# Altium footprint library General.PCBLIB: 226 footprints (part 3 of 15)
Each footprint in its own frame and in the unit in brackets; x right, y up, seen from the top. Pads: shape width x height; smd on the part's side, far side on the other; paste and mask are expansions set on the pad; w line width, h text height; cw(c..) or ccw(c..) is an arc to the next point about the centre after c.
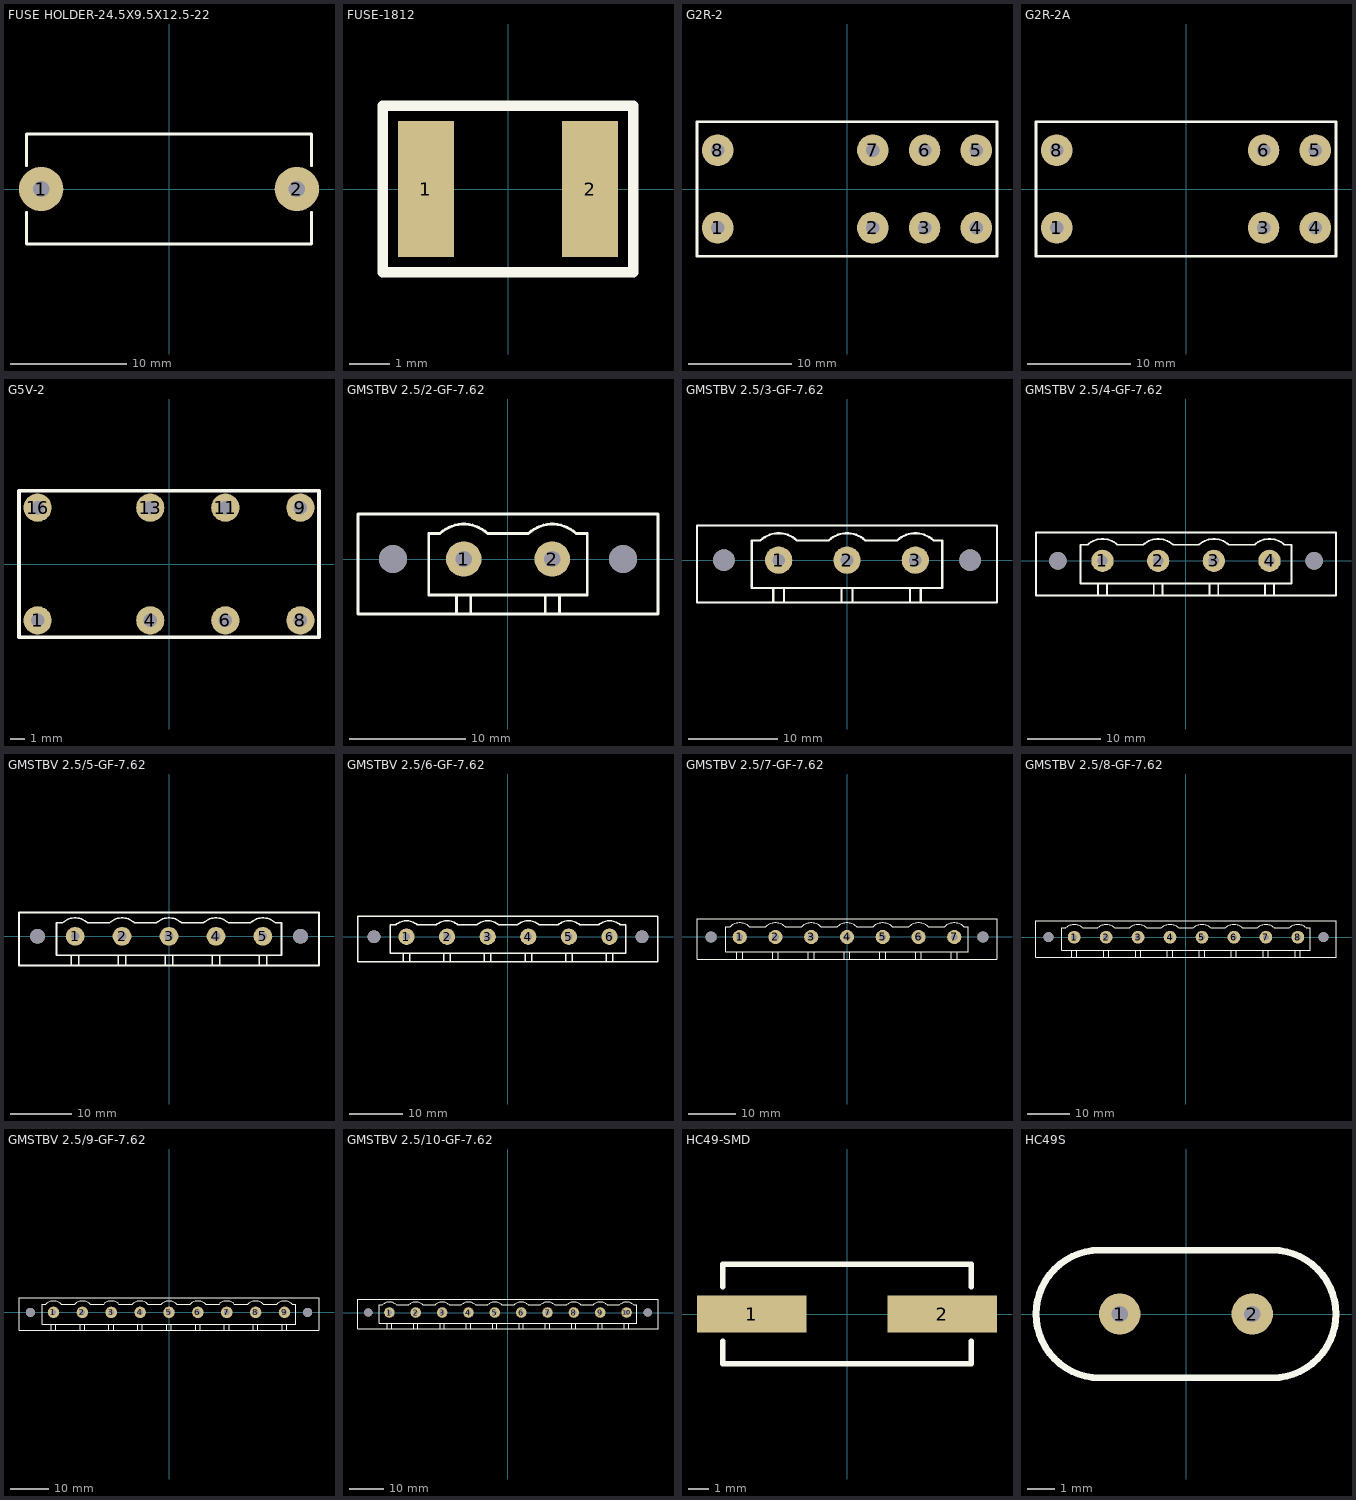
[diagram p2: the footprints below, top view; thin cyan lines are the x and y axes]

## FUSE HOLDER-24.5X9.5X12.5-22 [mm] "Fuse holder, 5*20mm fuse"
height 12.5
pads (2):
  round 3.81 hole 1.4: 1(-11,0) 2(11,0)
Top Overlay:
  lines w0.254: -12.25,-2 -12.25,-4.75 12.25,-4.75 12.25,-2 ; -12.25,2 -12.25,4.75 12.25,4.75 12.25,2
3D body: height 12.5, standoff -2.81, extent -12.25,-4.75 12.25,4.75

## FUSE-1812 [mm] "Fuse, SMD, 1812"
height 1
pads (2):
  rect 1.4x3.4 smd: 1(-2.05,0) 2(2.05,0)
Top Overlay:
  lines w0.254: -3.13,-2.08 -3.13,2.08 3.13,2.08 3.13,-2.08 -3.13,-2.08
3D body: height 1.03, standoff 0, extent -2.37,-1.74 2.365,1.74

## G2R-2 [mm] "Relay, OMRON"
height 25.5
pads (8):
  round 3.048 hole 1.3: 1(-12.5,-3.75) 2(2.5,-3.75) 3(7.5,-3.75) 4(12.5,-3.75) 5(12.5,3.75) 6(7.5,3.75) 7(2.5,3.75) 8(-12.5,3.75)
Top Overlay:
  lines w0.254: -14.5,-6.5 -14.5,6.5 14.5,6.5 14.5,-6.5 -14.5,-6.5
3D body: height 25.5, standoff -4, extent -14.5,-6.75 14.5,6.75

## G2R-2A [mm] "Relay, OMRON"
height 25.5
pads (6):
  round 3.048 hole 1.3: 1(-12.5,-3.75) 3(7.5,-3.75) 4(12.5,-3.75) 5(12.5,3.75) 6(7.5,3.75) 8(-12.5,3.75)
Top Overlay:
  lines w0.254: -14.5,-6.5 14.5,-6.5 14.5,6.5 -14.5,6.5 -14.5,-6.5
3D body: height 25.5, standoff -4, extent -14.5,-6.75 14.5,6.75

## G5V-2 [mm] "Relay, OMRON"
height 11.5
pads (8):
  round 1.905 hole 0.9: 1(-8.89,-3.81) 4(-1.27,-3.81) 6(3.81,-3.81) 8(8.89,-3.81) 9(8.89,3.81) 11(3.81,3.81) 13(-1.27,3.81) 16(-8.89,3.81)
Top Overlay:
  lines w0.254: -10.15,-4.95 -10.15,4.95 10.15,4.95 10.15,-4.95 -10.15,-4.95
3D body: height 11.5, standoff -3, extent -10.25,-5.05 10.25,5.05

## GMSTBV 2.5/2-GF-7.62 [mm] "Socket, PHOENIX CONTACT"
height 12.5
pads (4):
  round 3.048 hole 1.4: 1(-3.81,0) 2(3.81,0)
  round 2.4 hole 2.4 unplated: ""(-9.91,0) ""(9.91,0)
Top Overlay:
  lines w0.254: -4.415,-4.73 -4.415,-3.093 ; -3.205,-4.73 -3.205,-3.093 ; 3.205,-4.73 3.205,-3.093 ; 4.415,-4.73 4.415,-3.093 ; -12.91,-4.73 -12.91,3.87 12.91,3.87 12.91,-4.73 -12.91,-4.73 ; -6.82,-3.093 6.82,-3.093 6.82,2.2 5.85,2.2 ccw(c3.81,0) 1.77,2.2 -1.77,2.2 ccw(c-3.81,0) -5.85,2.2 -6.82,2.2 -6.82,-3.093
3D body: height 12.49, standoff -3.41, extent -12.91,-4.73 12.91,3.87

## GMSTBV 2.5/3-GF-7.62 [mm] "Socket, PHOENIX CONTACT"
height 12.5
pads (5):
  round 3.048 hole 1.4: 1(-7.62,0) 2(0,0) 3(7.62,0)
  round 2.4 hole 2.4 unplated: ""(-13.72,0) ""(13.72,0)
Top Overlay:
  lines w0.254: -8.225,-4.73 -8.225,-3.093 ; -7.015,-4.73 -7.015,-3.093 ; -0.605,-4.73 -0.605,-3.093 ; 0.605,-4.73 0.605,-3.093 ; 3.01,2.2 2.04,2.2 ; 7.015,-4.73 7.015,-3.093 ; 8.225,-4.73 8.225,-3.093 ; 2.04,2.2 ccw(c0,0) -2.04,2.2 -5.58,2.2 ccw(c-7.62,0) -9.66,2.2 -10.63,2.2 -10.63,-3.093 10.63,-3.093 10.63,2.2 9.66,2.2 ccw(c7.62,0) 5.58,2.2 2.04,2.2 ; -16.72,-4.73 -16.72,3.87 16.72,3.87 16.72,-4.73 -16.72,-4.73
3D body: height 12.49, standoff -3.41, extent -16.72,-4.73 16.72,3.87

## GMSTBV 2.5/4-GF-7.62 [mm] "Socket, PHOENIX CONTACT"
height 12.5
pads (6):
  round 3.048 hole 1.4: 1(-11.43,0) 2(-3.81,0) 3(3.81,0) 4(11.43,0)
  round 2.4 hole 2.4 unplated: ""(-17.53,0) ""(17.53,0)
Top Overlay:
  lines w0.254: -12.035,-4.73 -12.035,-3.093 ; -10.825,-4.73 -10.825,-3.093 ; -4.415,-4.73 -4.415,-3.093 ; -3.205,-4.73 -3.205,-3.093 ; -0.8,2.2 -1.77,2.2 ; 3.205,-4.73 3.205,-3.093 ; 4.415,-4.73 4.415,-3.093 ; 6.82,2.2 5.85,2.2 ; 10.825,-4.73 10.825,-3.093 ; 12.035,-4.73 12.035,-3.093 ; -1.77,2.2 ccw(c-3.81,0) -5.85,2.2 -9.39,2.2 ccw(c-11.43,0) -13.47,2.2 -14.44,2.2 -14.44,-3.093 14.44,-3.093 14.44,2.2 13.47,2.2 ccw(c11.43,0) 9.39,2.2 5.85,2.2 ; -1.77,2.2 1.77,2.2 cw(c3.81,0) 5.85,2.2 ; -20.53,-4.73 20.53,-4.73 20.53,3.87 -20.53,3.87 -20.53,-4.73
3D body: height 12.49, standoff -3.41, extent -20.53,-4.73 20.53,3.87

## GMSTBV 2.5/5-GF-7.62 [mm] "Socket, PHOENIX CONTACT"
height 12.5
pads (7):
  round 3.048 hole 1.4: 1(-15.24,0) 2(-7.62,0) 3(0,0) 4(7.62,0) 5(15.24,0)
  round 2.4 hole 2.4 unplated: ""(-21.34,0) ""(21.34,0)
Top Overlay:
  lines w0.254: -15.845,-4.73 -15.845,-3.093 ; -14.635,-4.73 -14.635,-3.093 ; -8.225,-4.73 -8.225,-3.093 ; -7.015,-4.73 -7.015,-3.093 ; -4.61,2.2 -5.58,2.2 ; -0.605,-4.73 -0.605,-3.093 ; 0.605,-4.73 0.605,-3.093 ; 3.01,2.2 2.04,2.2 ; 7.015,-4.73 7.015,-3.093 ; 8.225,-4.73 8.225,-3.093 ; 14.635,-4.73 14.635,-3.093 ; 15.845,-4.73 15.845,-3.093 ; -5.58,2.2 ccw(c-7.62,0) -9.66,2.2 -13.2,2.2 ccw(c-15.24,0) -17.28,2.2 -18.25,2.2 -18.25,-3.093 18.25,-3.093 18.25,2.2 17.28,2.2 ccw(c15.24,0) 13.2,2.2 9.66,2.2 ; -5.58,2.2 -2.04,2.2 cw(c0,0) 2.04,2.2 ; 2.04,2.2 5.58,2.2 cw(c7.62,0) 9.66,2.2 ; 9.66,2.2 10.63,2.2 9.66,2.2 ; -24.34,-4.73 -24.34,3.87 24.34,3.87 24.34,-4.73 -24.34,-4.73
3D body: height 12.49, standoff -3.41, extent -24.34,-4.73 24.34,3.87

## GMSTBV 2.5/6-GF-7.62 [mm] "Socket, PHOENIX CONTACT"
height 12.5
pads (8):
  round 3.048 hole 1.4: 1(-19.05,0) 2(-11.43,0) 3(-3.81,0) 4(3.81,0) 5(11.43,0) 6(19.05,0)
  round 2.4 hole 2.4 unplated: ""(-25.15,0) ""(25.15,0)
Top Overlay:
  lines w0.254: -19.655,-4.73 -19.655,-3.093 ; -18.445,-4.73 -18.445,-3.093 ; -12.035,-4.73 -12.035,-3.093 ; -10.825,-4.73 -10.825,-3.093 ; -8.42,2.2 -9.39,2.2 ; -4.415,-4.73 -4.415,-3.093 ; -3.205,-4.73 -3.205,-3.093 ; -0.8,2.2 -1.77,2.2 ; 3.205,-4.73 3.205,-3.093 ; 4.415,-4.73 4.415,-3.093 ; 10.825,-4.73 10.825,-3.093 ; 12.035,-4.73 12.035,-3.093 ; 18.445,-4.73 18.445,-3.093 ; 19.655,-4.73 19.655,-3.093 ; -9.39,2.2 ccw(c-11.43,0) -13.47,2.2 -17.01,2.2 ccw(c-19.05,0) -21.09,2.2 -22.06,2.2 -22.06,-3.093 22.06,-3.093 22.06,2.2 21.09,2.2 ccw(c19.05,0) 17.01,2.2 13.47,2.2 ; -9.39,2.2 -5.85,2.2 cw(c-3.81,0) -1.77,2.2 ; -1.77,2.2 1.77,2.2 cw(c3.81,0) 5.85,2.2 ; 5.85,2.2 6.82,2.2 5.85,2.2 ; 5.85,2.2 9.39,2.2 cw(c11.43,0) 13.47,2.2 ; 13.47,2.2 14.44,2.2 ; 13.47,2.2 14.44,2.2 ; 13.47,2.2 14.44,2.2 ; -28.15,-4.73 28.15,-4.73 28.15,3.87 -28.15,3.87 -28.15,-4.73
3D body: height 12.49, standoff -3.41, extent -28.15,-4.73 28.15,3.87

## GMSTBV 2.5/7-GF-7.62 [mm] "Socket, PHOENIX CONTACT"
height 12.5
pads (9):
  round 3.048 hole 1.4: 1(-22.86,0) 2(-15.24,0) 3(-7.62,0) 4(0,0) 5(7.62,0) 6(15.24,0) 7(22.86,0)
  round 2.4 hole 2.4 unplated: ""(-28.96,0) ""(28.96,0)
Top Overlay:
  lines w0.254: -23.465,-4.73 -23.465,-3.093 ; -22.255,-4.73 -22.255,-3.093 ; -15.845,-4.73 -15.845,-3.093 ; -14.635,-4.73 -14.635,-3.093 ; -12.23,2.2 -13.2,2.2 ; -8.225,-4.73 -8.225,-3.093 ; -7.015,-4.73 -7.015,-3.093 ; -4.61,2.2 -5.58,2.2 ; -0.605,-4.73 -0.605,-3.093 ; 0.605,-4.73 0.605,-3.093 ; 7.015,-4.73 7.015,-3.093 ; 8.225,-4.73 8.225,-3.093 ; 14.635,-4.73 14.635,-3.093 ; 15.845,-4.73 15.845,-3.093 ; 22.255,-4.73 22.255,-3.093 ; 23.465,-4.73 23.465,-3.093 ; -13.2,2.2 ccw(c-15.24,0) -17.28,2.2 -20.82,2.2 ccw(c-22.86,0) -24.9,2.2 -25.87,2.2 -25.87,-3.093 25.87,-3.093 25.87,2.2 24.9,2.2 ccw(c22.86,0) 20.82,2.2 17.28,2.2 ; -13.2,2.2 -9.66,2.2 cw(c-7.62,0) -5.58,2.2 ; -5.58,2.2 -2.04,2.2 cw(c0,0) 2.04,2.2 ; 2.04,2.2 3.01,2.2 2.04,2.2 ; 2.04,2.2 5.58,2.2 cw(c7.62,0) 9.66,2.2 ; 9.66,2.2 10.63,2.2 ; 9.66,2.2 13.2,2.2 cw(c15.24,0) 17.28,2.2 ; 9.66,2.2 10.63,2.2 ; 9.66,2.2 10.63,2.2 ; 17.28,2.2 18.25,2.2 ; 17.28,2.2 18.25,2.2 ; 17.28,2.2 18.25,2.2 ; 17.28,2.2 18.25,2.2 ; -31.96,-4.73 -31.96,3.87 31.96,3.87 31.96,-4.73 -31.96,-4.73
3D body: height 12.49, standoff -3.41, extent -31.96,-4.73 31.96,3.87

## GMSTBV 2.5/8-GF-7.62 [mm] "Socket, PHOENIX CONTACT"
height 12.5
pads (10):
  round 3.048 hole 1.4: 1(-26.67,0) 2(-19.05,0) 3(-11.43,0) 4(-3.81,0) 5(3.81,0) 6(11.43,0) 7(19.05,0) 8(26.67,0)
  round 2.4 hole 2.4 unplated: ""(-32.77,0) ""(32.77,0)
Top Overlay:
  lines w0.254: -27.275,-4.73 -27.275,-3.093 ; -26.065,-4.73 -26.065,-3.093 ; -19.655,-4.73 -19.655,-3.093 ; -18.445,-4.73 -18.445,-3.093 ; -16.04,2.2 -17.01,2.2 ; -12.035,-4.73 -12.035,-3.093 ; -10.825,-4.73 -10.825,-3.093 ; -8.42,2.2 -9.39,2.2 ; -4.415,-4.73 -4.415,-3.093 ; -3.205,-4.73 -3.205,-3.093 ; 3.205,-4.73 3.205,-3.093 ; 4.415,-4.73 4.415,-3.093 ; 10.825,-4.73 10.825,-3.093 ; 12.035,-4.73 12.035,-3.093 ; 18.445,-4.73 18.445,-3.093 ; 19.655,-4.73 19.655,-3.093 ; 26.065,-4.73 26.065,-3.093 ; 27.275,-4.73 27.275,-3.093 ; -17.01,2.2 ccw(c-19.05,0) -21.09,2.2 -24.63,2.2 ccw(c-26.67,0) -28.71,2.2 -29.68,2.2 -29.68,-3.093 29.68,-3.093 29.68,2.2 28.71,2.2 ccw(c26.67,0) 24.63,2.2 21.09,2.2 ; -17.01,2.2 -13.47,2.2 cw(c-11.43,0) -9.39,2.2 ; -9.39,2.2 -5.85,2.2 cw(c-3.81,0) -1.77,2.2 ; -1.77,2.2 -0.8,2.2 -1.77,2.2 ; -1.77,2.2 1.77,2.2 cw(c3.81,0) 5.85,2.2 ; 5.85,2.2 6.82,2.2 ; 5.85,2.2 9.39,2.2 cw(c11.43,0) 13.47,2.2 ; 5.85,2.2 6.82,2.2 ; 5.85,2.2 6.82,2.2 ; 13.47,2.2 14.44,2.2 ; 13.47,2.2 14.44,2.2 ; 13.47,2.2 14.44,2.2 ; 13.47,2.2 17.01,2.2 cw(c19.05,0) 21.09,2.2 ; 13.47,2.2 14.44,2.2 ; 21.09,2.2 22.06,2.2 ; 21.09,2.2 22.06,2.2 ; 21.09,2.2 22.06,2.2 ; 21.09,2.2 22.06,2.2 ; 21.09,2.2 22.06,2.2 ; -35.77,-4.73 -35.77,3.87 35.77,3.87 35.77,-4.73 -35.77,-4.73
3D body: height 12.49, standoff -3.41, extent -35.77,-4.73 35.77,3.87

## GMSTBV 2.5/9-GF-7.62 [mil] "Socket, PHOENIX CONTACT"
height 492.13
pads (11):
  round 120 hole 55.12: 1(-1200,0) 2(-900,0) 3(-600,0) 4(-300,0) 5(0,0) 6(300,0) 7(600,0) 8(900,0) 9(1200,0)
  round 94.49 hole 94.49 unplated: ""(-1440.16,0) ""(1440.16,0)
Top Overlay:
  lines w10: -1223.82,-186.22 -1223.82,-121.79 ; -1176.18,-186.22 -1176.18,-121.79 ; -923.82,-186.22 -923.82,-121.79 ; -876.18,-186.22 -876.18,-121.79 ; -781.5,86.61 -819.7,86.61 ; -623.82,-186.22 -623.82,-121.79 ; -576.18,-186.22 -576.18,-121.79 ; -481.5,86.61 -519.7,86.61 ; -323.82,-186.22 -323.82,-121.79 ; -276.18,-186.22 -276.18,-121.79 ; -23.82,-186.22 -23.82,-121.79 ; 23.82,-186.22 23.82,-121.79 ; 276.18,-186.22 276.18,-121.79 ; 323.82,-186.22 323.82,-121.79 ; 576.18,-186.22 576.18,-121.79 ; 623.82,-186.22 623.82,-121.79 ; 876.18,-186.22 876.18,-121.79 ; 923.82,-186.22 923.82,-121.79 ; 1176.18,-186.22 1176.18,-121.79 ; 1223.82,-186.22 1223.82,-121.79 ; -819.7,86.61 ccw(c-900,0) -980.3,86.61 -1119.7,86.61 ccw(c-1200,0) -1280.3,86.61 -1318.5,86.61 -1318.5,-121.79 1318.5,-121.79 1318.5,86.61 1280.3,86.61 ccw(c1200,0) 1119.7,86.61 980.3,86.61 ; -819.7,86.61 -680.3,86.61 cw(c-600,0) -519.7,86.61 ; -519.7,86.61 -380.3,86.61 cw(c-300,0) -219.7,86.61 ; -219.7,86.61 -181.5,86.61 -219.7,86.61 ; -219.7,86.61 -80.3,86.61 cw(c0,0) 80.3,86.61 ; 80.3,86.61 118.5,86.61 ; 80.3,86.61 118.5,86.61 ; 80.3,86.61 219.7,86.61 cw(c300,0) 380.3,86.61 ; 80.3,86.61 118.5,86.61 ; 380.3,86.61 418.5,86.61 ; 380.3,86.61 519.7,86.61 cw(c600,0) 680.3,86.61 ; 380.3,86.61 418.5,86.61 ; 380.3,86.61 418.5,86.61 ; 380.3,86.61 418.5,86.61 ; 680.3,86.61 718.5,86.61 ; 680.3,86.61 718.5,86.61 ; 680.3,86.61 718.5,86.61 ; 680.3,86.61 819.7,86.61 cw(c900,0) 980.3,86.61 ; 680.3,86.61 718.5,86.61 ; 680.3,86.61 718.5,86.61 ; 980.3,86.61 1018.5,86.61 ; 980.3,86.61 1018.5,86.61 ; 980.3,86.61 1018.5,86.61 ; 980.3,86.61 1018.5,86.61 ; 980.3,86.61 1018.5,86.61 ; 980.3,86.61 1018.5,86.61 ; -1558.27,-186.22 1558.27,-186.22 1558.27,152.36 -1558.27,152.36 -1558.27,-186.22
3D body: height 491.6, standoff -134.38, extent -1558.27,-186.22 1558.27,152.36

## GMSTBV 2.5/10-GF-7.62 [mil] "Socket, PHOENIX CONTACT"
height 492.13
pads (12):
  round 120 hole 55.12: 1(-1350,0) 2(-1050,0) 3(-750,0) 4(-450,0) 5(-150,0) 6(150,0) 7(450,0) 8(750,0) 9(1050,0) 10(1350,0)
  round 94.49 hole 94.49 unplated: ""(-1590.16,0) ""(1590.16,0)
Top Overlay:
  lines w10: -1373.82,-186.22 -1373.82,-121.79 ; -1326.18,-186.22 -1326.18,-121.79 ; -1073.82,-186.22 -1073.82,-121.79 ; -1026.18,-186.22 -1026.18,-121.79 ; -931.5,86.61 -969.7,86.61 ; -773.82,-186.22 -773.82,-121.79 ; -726.18,-186.22 -726.18,-121.79 ; -631.5,86.61 -669.7,86.61 ; -473.82,-186.22 -473.82,-121.79 ; -426.18,-186.22 -426.18,-121.79 ; -173.82,-186.22 -173.82,-121.79 ; -126.18,-186.22 -126.18,-121.79 ; 126.18,-186.22 126.18,-121.79 ; 173.82,-186.22 173.82,-121.79 ; 426.18,-186.22 426.18,-121.79 ; 473.82,-186.22 473.82,-121.79 ; 726.18,-186.22 726.18,-121.79 ; 773.82,-186.22 773.82,-121.79 ; 1026.18,-186.22 1026.18,-121.79 ; 1073.82,-186.22 1073.82,-121.79 ; 1326.18,-186.22 1326.18,-121.79 ; 1373.82,-186.22 1373.82,-121.79 ; -969.7,86.61 ccw(c-1050,0) -1130.3,86.61 -1269.7,86.61 ccw(c-1350,0) -1430.3,86.61 -1468.5,86.61 -1468.5,-121.79 1468.5,-121.79 1468.5,86.61 1430.3,86.61 ccw(c1350,0) 1269.7,86.61 1130.3,86.61 ; -969.7,86.61 -830.3,86.61 cw(c-750,0) -669.7,86.61 ; -669.7,86.61 -530.3,86.61 cw(c-450,0) -369.7,86.61 ; -369.7,86.61 -331.5,86.61 -369.7,86.61 ; -369.7,86.61 -230.3,86.61 cw(c-150,0) -69.7,86.61 ; -69.7,86.61 -31.5,86.61 ; -69.7,86.61 69.7,86.61 cw(c150,0) 230.3,86.61 ; -69.7,86.61 -31.5,86.61 ; -69.7,86.61 -31.5,86.61 ; 230.3,86.61 268.5,86.61 ; 230.3,86.61 268.5,86.61 ; 230.3,86.61 268.5,86.61 ; 230.3,86.61 369.7,86.61 cw(c450,0) 530.3,86.61 ; 230.3,86.61 268.5,86.61 ; 530.3,86.61 568.5,86.61 ; 530.3,86.61 568.5,86.61 ; 530.3,86.61 669.7,86.61 cw(c750,0) 830.3,86.61 ; 530.3,86.61 568.5,86.61 ; 530.3,86.61 568.5,86.61 ; 530.3,86.61 568.5,86.61 ; 830.3,86.61 868.5,86.61 ; 830.3,86.61 868.5,86.61 ; 830.3,86.61 868.5,86.61 ; 830.3,86.61 969.7,86.61 cw(c1050,0) 1130.3,86.61 ; 830.3,86.61 868.5,86.61 ; 830.3,86.61 868.5,86.61 ; 830.3,86.61 868.5,86.61 ; 1130.3,86.61 1168.5,86.61 ; 1130.3,86.61 1168.5,86.61 ; 1130.3,86.61 1168.5,86.61 ; 1130.3,86.61 1168.5,86.61 ; 1130.3,86.61 1168.5,86.61 ; 1130.3,86.61 1168.5,86.61 ; 1130.3,86.61 1168.5,86.61 ; -1708.27,-186.22 -1708.27,152.36 1708.27,152.36 1708.27,-186.22 -1708.27,-186.22
3D body: height 491.6, standoff -134.38, extent -1708.27,-186.22 1708.27,152.36

## HC49-SMD [mm] "CRYSTAL, SMD"
height 5.08
pads (2):
  rect 5.3x1.8 smd: 1(-4.6,0) 2(4.6,0)
Top Overlay:
  lines w0.254: -6,-1.3 -6,-2.4 6,-2.4 6,-1.3 ; -6,1.3 -6,2.4 6,2.4 6,1.3
3D body: height 4.2, standoff 0, extent -6.35,-2.35 6.35,2.35

## HC49S [mm] "CRYSTAL"
height 4.2
pads (2):
  round 1.524 hole 0.6: 1(-2.44,0) 2(2.44,0)
Top Overlay:
  lines w0.254: -3.175,-2.35 cw(c-3.175,0) -3.175,2.35 3.175,2.35 cw(c3.175,0) 3.175,-2.35 -3.175,-2.35
3D body: height 3.6, standoff -3, extent -5.49,-2.245 5.49,2.246